# Altium schematic symbol library jlcpcb_2025_04_inductors_extended_0402.schlib: 1396 symbols (part 6 of 8) (continued)
## SCC1005C3N3SSP
designator L?  Inductance: 3.3nH
Inductor, 3.3nH, 190mΩ, 400mA, SMD 0402; Manufacturer: Sunltech Tech; Manufacturer Part Number: SCC1005C3N3SSP; Package Size: 0402; JLCPCB Basic Part: No; JLCPCB Part Number: C219529; Supplier 1: LCSC; Category: Inductors; Supplier Part Number 1: C219529; Rated Current: 400mA; DC Resistance: 190mΩ; RoHS: Yes; ComponentLink1Description: Datasheet; ComponentLink1URL: https://wmsc.lcsc.com/wmsc/upload/file/pdf/v2/lcsc/2304140030_Sunltech-Tech-SCC1005C3N3SSP_C219529.pdf; ComponentLink2Description: JLCPCB Part URL; ComponentLink2URL: https://jlcpcb.com/partdetail/C219529; ComponentLink3Description: LCSC Part URL; ComponentLink3URL: https://lcsc.com/product-detail/Inductors-SMD_Sunltech-Tech-Sunltech-Tech-SCC1005C3N3SSP_C219529.html
footprint IND-0402 (0402 (1005M) Inductor)
pins: 1, 2

## SCC1005C3N6SSP
designator L?  Inductance: 3.6nH
Inductor, 3.6nH, 220mΩ, 400mA, SMD 0402; Manufacturer: Sunltech Tech; Manufacturer Part Number: SCC1005C3N6SSP; Package Size: 0402; JLCPCB Basic Part: No; JLCPCB Part Number: C219530; Supplier 1: LCSC; Category: Inductors; Supplier Part Number 1: C219530; Rated Current: 400mA; DC Resistance: 220mΩ; RoHS: Yes; ComponentLink1Description: Datasheet; ComponentLink1URL: https://wmsc.lcsc.com/wmsc/upload/file/pdf/v2/lcsc/2304140030_Sunltech-Tech-SCC1005C3N6SSP_C219530.pdf; ComponentLink2Description: JLCPCB Part URL; ComponentLink2URL: https://jlcpcb.com/partdetail/C219530; ComponentLink3Description: LCSC Part URL; ComponentLink3URL: https://lcsc.com/product-detail/Inductors-SMD_Sunltech-Tech-Sunltech-Tech-SCC1005C3N6SSP_C219530.html
footprint IND-0402 (0402 (1005M) Inductor)
pins: 1, 2

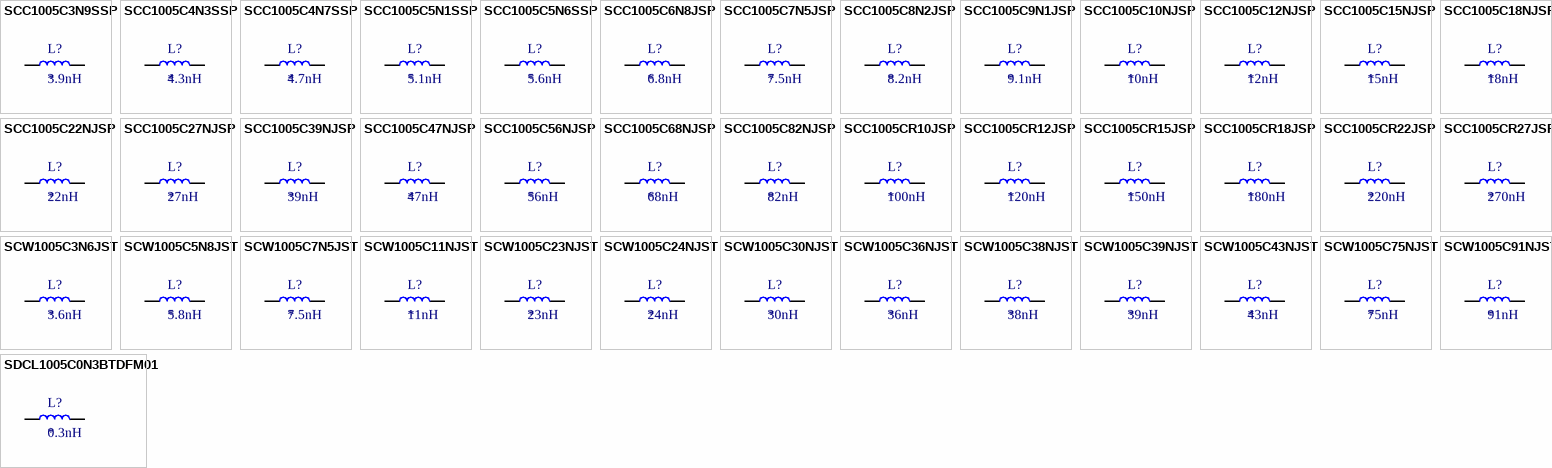
[diagram p25: symbols SCC1005C3N9SSP to SDCL1005C0N3BTDFM01]

## SCC1005C3N9SSP
designator L?  Inductance: 3.9nH
Inductor, 3.9nH, 220mΩ, 400mA, SMD 0402; Manufacturer: Sunltech Tech; Manufacturer Part Number: SCC1005C3N9SSP; Package Size: 0402; JLCPCB Basic Part: No; JLCPCB Part Number: C219531; Supplier 1: LCSC; Category: Inductors; Supplier Part Number 1: C219531; Rated Current: 400mA; DC Resistance: 220mΩ; RoHS: Yes; ComponentLink1Description: Datasheet; ComponentLink1URL: https://wmsc.lcsc.com/wmsc/upload/file/pdf/v2/lcsc/2304140030_Sunltech-Tech-SCC1005C3N9SSP_C219531.pdf; ComponentLink2Description: JLCPCB Part URL; ComponentLink2URL: https://jlcpcb.com/partdetail/C219531; ComponentLink3Description: LCSC Part URL; ComponentLink3URL: https://lcsc.com/product-detail/Inductors-SMD_Sunltech-Tech-Sunltech-Tech-SCC1005C3N9SSP_C219531.html
footprint IND-0402 (0402 (1005M) Inductor)
pins: 1, 2

## SCC1005C4N3SSP
designator L?  Inductance: 4.3nH
Inductor, 4.3nH, 240mΩ, 400mA, SMD 0402; Manufacturer: Sunltech Tech; Manufacturer Part Number: SCC1005C4N3SSP; Package Size: 0402; JLCPCB Basic Part: No; JLCPCB Part Number: C219532; Supplier 1: LCSC; Category: Inductors; Supplier Part Number 1: C219532; Rated Current: 400mA; DC Resistance: 240mΩ; RoHS: Yes; ComponentLink1Description: Datasheet; ComponentLink1URL: https://wmsc.lcsc.com/wmsc/upload/file/pdf/v2/lcsc/2304140030_Sunltech-Tech-SCC1005C4N3SSP_C219532.pdf; ComponentLink2Description: JLCPCB Part URL; ComponentLink2URL: https://jlcpcb.com/partdetail/C219532; ComponentLink3Description: LCSC Part URL; ComponentLink3URL: https://lcsc.com/product-detail/Inductors-SMD_Sunltech-Tech-Sunltech-Tech-SCC1005C4N3SSP_C219532.html
footprint IND-0402 (0402 (1005M) Inductor)
pins: 1, 2

## SCC1005C4N7SSP
designator L?  Inductance: 4.7nH
Inductor, 4.7nH, 240mΩ, 400mA, SMD 0402; Manufacturer: Sunltech Tech; Manufacturer Part Number: SCC1005C4N7SSP; Package Size: 0402; JLCPCB Basic Part: No; JLCPCB Part Number: C219533; Supplier 1: LCSC; Category: Inductors; Supplier Part Number 1: C219533; Rated Current: 400mA; DC Resistance: 240mΩ; RoHS: Yes; ComponentLink1Description: Datasheet; ComponentLink1URL: https://wmsc.lcsc.com/wmsc/upload/file/pdf/v2/lcsc/2304140030_Sunltech-Tech-SCC1005C4N7SSP_C219533.pdf; ComponentLink2Description: JLCPCB Part URL; ComponentLink2URL: https://jlcpcb.com/partdetail/C219533; ComponentLink3Description: LCSC Part URL; ComponentLink3URL: https://lcsc.com/product-detail/Inductors-SMD_Sunltech-Tech-Sunltech-Tech-SCC1005C4N7SSP_C219533.html
footprint IND-0402 (0402 (1005M) Inductor)
pins: 1, 2

## SCC1005C5N1SSP
designator L?  Inductance: 5.1nH
Inductor, 5.1nH, 260mΩ, 400mA, SMD 0402; Manufacturer: Sunltech Tech; Manufacturer Part Number: SCC1005C5N1SSP; Package Size: 0402; JLCPCB Basic Part: No; JLCPCB Part Number: C219534; Supplier 1: LCSC; Category: Inductors; Supplier Part Number 1: C219534; Rated Current: 400mA; DC Resistance: 260mΩ; RoHS: Yes; ComponentLink1Description: Datasheet; ComponentLink1URL: https://wmsc.lcsc.com/wmsc/upload/file/pdf/v2/lcsc/2304140030_Sunltech-Tech-SCC1005C5N1SSP_C219534.pdf; ComponentLink2Description: JLCPCB Part URL; ComponentLink2URL: https://jlcpcb.com/partdetail/C219534; ComponentLink3Description: LCSC Part URL; ComponentLink3URL: https://lcsc.com/product-detail/Inductors-SMD_Sunltech-Tech-Sunltech-Tech-SCC1005C5N1SSP_C219534.html
footprint IND-0402 (0402 (1005M) Inductor)
pins: 1, 2

## SCC1005C5N6SSP
designator L?  Inductance: 5.6nH
Inductor, 5.6nH, 270mΩ, 400mA, SMD 0402; Manufacturer: Sunltech Tech; Manufacturer Part Number: SCC1005C5N6SSP; Package Size: 0402; JLCPCB Basic Part: No; JLCPCB Part Number: C219535; Supplier 1: LCSC; Category: Inductors; Supplier Part Number 1: C219535; Rated Current: 400mA; DC Resistance: 270mΩ; RoHS: Yes; ComponentLink1Description: Datasheet; ComponentLink1URL: https://wmsc.lcsc.com/wmsc/upload/file/pdf/v2/lcsc/2304140030_Sunltech-Tech-SCC1005C5N6SSP_C219535.pdf; ComponentLink2Description: JLCPCB Part URL; ComponentLink2URL: https://jlcpcb.com/partdetail/C219535; ComponentLink3Description: LCSC Part URL; ComponentLink3URL: https://lcsc.com/product-detail/Inductors-SMD_Sunltech-Tech-Sunltech-Tech-SCC1005C5N6SSP_C219535.html
footprint IND-0402 (0402 (1005M) Inductor)
pins: 1, 2

## SCC1005C6N8JSP
designator L?  Inductance: 6.8nH
Inductor, 6.8nH, ±5%, 320mΩ, 300mA, SMD 0402; Manufacturer: Sunltech Tech; Manufacturer Part Number: SCC1005C6N8JSP; Package Size: 0402; JLCPCB Basic Part: No; JLCPCB Part Number: C219537; Supplier 1: LCSC; Category: Inductors; Supplier Part Number 1: C219537; Tolerance: ±5%; Rated Current: 300mA; DC Resistance: 320mΩ; RoHS: Yes; ComponentLink1Description: Datasheet; ComponentLink1URL: https://wmsc.lcsc.com/wmsc/upload/file/pdf/v2/lcsc/2304140030_Sunltech-Tech-SCC1005C6N8JSP_C219537.pdf; ComponentLink2Description: JLCPCB Part URL; ComponentLink2URL: https://jlcpcb.com/partdetail/C219537; ComponentLink3Description: LCSC Part URL; ComponentLink3URL: https://lcsc.com/product-detail/Inductors-SMD_Sunltech-Tech-Sunltech-Tech-SCC1005C6N8JSP_C219537.html
footprint IND-0402 (0402 (1005M) Inductor)
pins: 1, 2

## SCC1005C7N5JSP
designator L?  Inductance: 7.5nH
Inductor, 7.5nH, ±5%, 370mΩ, 300mA, SMD 0402; Manufacturer: Sunltech Tech; Manufacturer Part Number: SCC1005C7N5JSP; Package Size: 0402; JLCPCB Basic Part: No; JLCPCB Part Number: C219538; Supplier 1: LCSC; Category: Inductors; Supplier Part Number 1: C219538; Tolerance: ±5%; Rated Current: 300mA; DC Resistance: 370mΩ; RoHS: Yes; ComponentLink1Description: Datasheet; ComponentLink1URL: https://wmsc.lcsc.com/wmsc/upload/file/pdf/v2/lcsc/2304140030_Sunltech-Tech-SCC1005C7N5JSP_C219538.pdf; ComponentLink2Description: JLCPCB Part URL; ComponentLink2URL: https://jlcpcb.com/partdetail/C219538; ComponentLink3Description: LCSC Part URL; ComponentLink3URL: https://lcsc.com/product-detail/Inductors-SMD_Sunltech-Tech-Sunltech-Tech-SCC1005C7N5JSP_C219538.html
footprint IND-0402 (0402 (1005M) Inductor)
pins: 1, 2

## SCC1005C8N2JSP
designator L?  Inductance: 8.2nH
Inductor, 8.2nH, ±5%, 370mΩ, 300mA, SMD 0402; Manufacturer: Sunltech Tech; Manufacturer Part Number: SCC1005C8N2JSP; Package Size: 0402; JLCPCB Basic Part: No; JLCPCB Part Number: C219539; Supplier 1: LCSC; Category: Inductors; Supplier Part Number 1: C219539; Tolerance: ±5%; Rated Current: 300mA; DC Resistance: 370mΩ; RoHS: Yes; ComponentLink1Description: Datasheet; ComponentLink1URL: https://wmsc.lcsc.com/wmsc/upload/file/pdf/v2/lcsc/2304140030_Sunltech-Tech-SCC1005C8N2JSP_C219539.pdf; ComponentLink2Description: JLCPCB Part URL; ComponentLink2URL: https://jlcpcb.com/partdetail/C219539; ComponentLink3Description: LCSC Part URL; ComponentLink3URL: https://lcsc.com/product-detail/Inductors-SMD_Sunltech-Tech-Sunltech-Tech-SCC1005C8N2JSP_C219539.html
footprint IND-0402 (0402 (1005M) Inductor)
pins: 1, 2

## SCC1005C9N1JSP
designator L?  Inductance: 9.1nH
Inductor, 9.1nH, ±5%, 420mΩ, 300mA, SMD 0402; Manufacturer: Sunltech Tech; Manufacturer Part Number: SCC1005C9N1JSP; Package Size: 0402; JLCPCB Basic Part: No; JLCPCB Part Number: C219540; Supplier 1: LCSC; Category: Inductors; Supplier Part Number 1: C219540; Tolerance: ±5%; Rated Current: 300mA; DC Resistance: 420mΩ; RoHS: Yes; ComponentLink1Description: Datasheet; ComponentLink1URL: https://wmsc.lcsc.com/wmsc/upload/file/pdf/v2/lcsc/2304140030_Sunltech-Tech-SCC1005C9N1JSP_C219540.pdf; ComponentLink2Description: JLCPCB Part URL; ComponentLink2URL: https://jlcpcb.com/partdetail/C219540; ComponentLink3Description: LCSC Part URL; ComponentLink3URL: https://lcsc.com/product-detail/Inductors-SMD_Sunltech-Tech-Sunltech-Tech-SCC1005C9N1JSP_C219540.html
footprint IND-0402 (0402 (1005M) Inductor)
pins: 1, 2

## SCC1005C10NJSP
designator L?  Inductance: 10nH
Inductor, 10nH, ±5%, 420mΩ, 300mA, SMD 0402; Manufacturer: Sunltech Tech; Manufacturer Part Number: SCC1005C10NJSP; Package Size: 0402; JLCPCB Basic Part: No; JLCPCB Part Number: C219541; Supplier 1: LCSC; Category: Inductors; Supplier Part Number 1: C219541; Tolerance: ±5%; Rated Current: 300mA; DC Resistance: 420mΩ; RoHS: Yes; ComponentLink1Description: Datasheet; ComponentLink1URL: https://wmsc.lcsc.com/wmsc/upload/file/pdf/v2/lcsc/2304140030_Sunltech-Tech-SCC1005C10NJSP_C219541.pdf; ComponentLink2Description: JLCPCB Part URL; ComponentLink2URL: https://jlcpcb.com/partdetail/C219541; ComponentLink3Description: LCSC Part URL; ComponentLink3URL: https://lcsc.com/product-detail/Inductors-SMD_Sunltech-Tech-Sunltech-Tech-SCC1005C10NJSP_C219541.html
footprint IND-0402 (0402 (1005M) Inductor)
pins: 1, 2

## SCC1005C12NJSP
designator L?  Inductance: 12nH
Inductor, 12nH, ±5%, 500mΩ, 300mA, SMD 0402; Manufacturer: Sunltech Tech; Manufacturer Part Number: SCC1005C12NJSP; Package Size: 0402; JLCPCB Basic Part: No; JLCPCB Part Number: C219542; Supplier 1: LCSC; Category: Inductors; Supplier Part Number 1: C219542; Tolerance: ±5%; Rated Current: 300mA; DC Resistance: 500mΩ; RoHS: Yes; ComponentLink1Description: Datasheet; ComponentLink1URL: https://wmsc.lcsc.com/wmsc/upload/file/pdf/v2/lcsc/2304140030_Sunltech-Tech-SCC1005C12NJSP_C219542.pdf; ComponentLink2Description: JLCPCB Part URL; ComponentLink2URL: https://jlcpcb.com/partdetail/C219542; ComponentLink3Description: LCSC Part URL; ComponentLink3URL: https://lcsc.com/product-detail/Inductors-SMD_Sunltech-Tech-Sunltech-Tech-SCC1005C12NJSP_C219542.html
footprint IND-0402 (0402 (1005M) Inductor)
pins: 1, 2

## SCC1005C15NJSP
designator L?  Inductance: 15nH
Inductor, 15nH, ±5%, 550mΩ, 300mA, SMD 0402; Manufacturer: Sunltech Tech; Manufacturer Part Number: SCC1005C15NJSP; Package Size: 0402; JLCPCB Basic Part: No; JLCPCB Part Number: C219543; Supplier 1: LCSC; Category: Inductors; Supplier Part Number 1: C219543; Tolerance: ±5%; Rated Current: 300mA; DC Resistance: 550mΩ; RoHS: Yes; ComponentLink1Description: Datasheet; ComponentLink1URL: https://wmsc.lcsc.com/wmsc/upload/file/pdf/v2/lcsc/2304140030_Sunltech-Tech-SCC1005C15NJSP_C219543.pdf; ComponentLink2Description: JLCPCB Part URL; ComponentLink2URL: https://jlcpcb.com/partdetail/C219543; ComponentLink3Description: LCSC Part URL; ComponentLink3URL: https://lcsc.com/product-detail/Inductors-SMD_Sunltech-Tech-Sunltech-Tech-SCC1005C15NJSP_C219543.html
footprint IND-0402 (0402 (1005M) Inductor)
pins: 1, 2

## SCC1005C18NJSP
designator L?  Inductance: 18nH
Inductor, 18nH, ±5%, 650mΩ, 300mA, SMD 0402; Manufacturer: Sunltech Tech; Manufacturer Part Number: SCC1005C18NJSP; Package Size: 0402; JLCPCB Basic Part: No; JLCPCB Part Number: C219544; Supplier 1: LCSC; Category: Inductors; Supplier Part Number 1: C219544; Tolerance: ±5%; Rated Current: 300mA; DC Resistance: 650mΩ; RoHS: Yes; ComponentLink1Description: Datasheet; ComponentLink1URL: https://wmsc.lcsc.com/wmsc/upload/file/pdf/v2/lcsc/2304140030_Sunltech-Tech-SCC1005C18NJSP_C219544.pdf; ComponentLink2Description: JLCPCB Part URL; ComponentLink2URL: https://jlcpcb.com/partdetail/C219544; ComponentLink3Description: LCSC Part URL; ComponentLink3URL: https://lcsc.com/product-detail/Inductors-SMD_Sunltech-Tech-Sunltech-Tech-SCC1005C18NJSP_C219544.html
footprint IND-0402 (0402 (1005M) Inductor)
pins: 1, 2

## SCC1005C22NJSP
designator L?  Inductance: 22nH
Inductor, 22nH, ±5%, 800mΩ, 200mA, SMD 0402; Manufacturer: Sunltech Tech; Manufacturer Part Number: SCC1005C22NJSP; Package Size: 0402; JLCPCB Basic Part: No; JLCPCB Part Number: C219545; Supplier 1: LCSC; Category: Inductors; Supplier Part Number 1: C219545; Tolerance: ±5%; Rated Current: 200mA; DC Resistance: 800mΩ; RoHS: Yes; ComponentLink1Description: Datasheet; ComponentLink1URL: https://wmsc.lcsc.com/wmsc/upload/file/pdf/v2/lcsc/2304140030_Sunltech-Tech-SCC1005C22NJSP_C219545.pdf; ComponentLink2Description: JLCPCB Part URL; ComponentLink2URL: https://jlcpcb.com/partdetail/C219545; ComponentLink3Description: LCSC Part URL; ComponentLink3URL: https://lcsc.com/product-detail/Inductors-SMD_Sunltech-Tech-Sunltech-Tech-SCC1005C22NJSP_C219545.html
footprint IND-0402 (0402 (1005M) Inductor)
pins: 1, 2

## SCC1005C27NJSP
designator L?  Inductance: 27nH
Inductor, 27nH, ±5%, 900mΩ, 200mA, SMD 0402; Manufacturer: Sunltech Tech; Manufacturer Part Number: SCC1005C27NJSP; Package Size: 0402; JLCPCB Basic Part: No; JLCPCB Part Number: C219546; Supplier 1: LCSC; Category: Inductors; Supplier Part Number 1: C219546; Tolerance: ±5%; Rated Current: 200mA; DC Resistance: 900mΩ; RoHS: Yes; ComponentLink1Description: Datasheet; ComponentLink1URL: https://wmsc.lcsc.com/wmsc/upload/file/pdf/v2/lcsc/2304140030_Sunltech-Tech-SCC1005C27NJSP_C219546.pdf; ComponentLink2Description: JLCPCB Part URL; ComponentLink2URL: https://jlcpcb.com/partdetail/C219546; ComponentLink3Description: LCSC Part URL; ComponentLink3URL: https://lcsc.com/product-detail/Inductors-SMD_Sunltech-Tech-Sunltech-Tech-SCC1005C27NJSP_C219546.html
footprint IND-0402 (0402 (1005M) Inductor)
pins: 1, 2

## SCC1005C39NJSP
designator L?  Inductance: 39nH
Inductor, 39nH, ±5%, 1.2Ω, 150mA, SMD 0402; Manufacturer: Sunltech Tech; Manufacturer Part Number: SCC1005C39NJSP; Package Size: 0402; JLCPCB Basic Part: No; JLCPCB Part Number: C219548; Supplier 1: LCSC; Category: Inductors; Supplier Part Number 1: C219548; Tolerance: ±5%; Rated Current: 150mA; DC Resistance: 1.2Ω; RoHS: Yes; ComponentLink1Description: Datasheet; ComponentLink1URL: https://wmsc.lcsc.com/wmsc/upload/file/pdf/v2/lcsc/2304140030_Sunltech-Tech-SCC1005C39NJSP_C219548.pdf; ComponentLink2Description: JLCPCB Part URL; ComponentLink2URL: https://jlcpcb.com/partdetail/C219548; ComponentLink3Description: LCSC Part URL; ComponentLink3URL: https://lcsc.com/product-detail/Inductors-SMD_Sunltech-Tech-Sunltech-Tech-SCC1005C39NJSP_C219548.html
footprint IND-0402 (0402 (1005M) Inductor)
pins: 1, 2

## SCC1005C47NJSP
designator L?  Inductance: 47nH
Inductor, 47nH, ±5%, 1.3Ω, 150mA, SMD 0402; Manufacturer: Sunltech Tech; Manufacturer Part Number: SCC1005C47NJSP; Package Size: 0402; JLCPCB Basic Part: No; JLCPCB Part Number: C219549; Supplier 1: LCSC; Category: Inductors; Supplier Part Number 1: C219549; Tolerance: ±5%; Rated Current: 150mA; DC Resistance: 1.3Ω; RoHS: Yes; ComponentLink1Description: Datasheet; ComponentLink1URL: https://wmsc.lcsc.com/wmsc/upload/file/pdf/v2/lcsc/2304140030_Sunltech-Tech-SCC1005C47NJSP_C219549.pdf; ComponentLink2Description: JLCPCB Part URL; ComponentLink2URL: https://jlcpcb.com/partdetail/C219549; ComponentLink3Description: LCSC Part URL; ComponentLink3URL: https://lcsc.com/product-detail/Inductors-SMD_Sunltech-Tech-Sunltech-Tech-SCC1005C47NJSP_C219549.html
footprint IND-0402 (0402 (1005M) Inductor)
pins: 1, 2

## SCC1005C56NJSP
designator L?  Inductance: 56nH
Inductor, 56nH, ±5%, 1.6Ω, 150mA, SMD 0402; Manufacturer: Sunltech Tech; Manufacturer Part Number: SCC1005C56NJSP; Package Size: 0402; JLCPCB Basic Part: No; JLCPCB Part Number: C219550; Supplier 1: LCSC; Category: Inductors; Supplier Part Number 1: C219550; Tolerance: ±5%; Rated Current: 150mA; DC Resistance: 1.6Ω; RoHS: Yes; ComponentLink1Description: Datasheet; ComponentLink1URL: https://wmsc.lcsc.com/wmsc/upload/file/pdf/v2/lcsc/2304140030_Sunltech-Tech-SCC1005C56NJSP_C219550.pdf; ComponentLink2Description: JLCPCB Part URL; ComponentLink2URL: https://jlcpcb.com/partdetail/C219550; ComponentLink3Description: LCSC Part URL; ComponentLink3URL: https://lcsc.com/product-detail/Inductors-SMD_Sunltech-Tech-Sunltech-Tech-SCC1005C56NJSP_C219550.html
footprint IND-0402 (0402 (1005M) Inductor)
pins: 1, 2

## SCC1005C68NJSP
designator L?  Inductance: 68nH
Inductor, 68nH, ±5%, 2.1Ω, 150mA, SMD 0402; Manufacturer: Sunltech Tech; Manufacturer Part Number: SCC1005C68NJSP; Package Size: 0402; JLCPCB Basic Part: No; JLCPCB Part Number: C219551; Supplier 1: LCSC; Category: Inductors; Supplier Part Number 1: C219551; Tolerance: ±5%; Rated Current: 150mA; DC Resistance: 2.1Ω; RoHS: Yes; ComponentLink1Description: Datasheet; ComponentLink1URL: https://wmsc.lcsc.com/wmsc/upload/file/pdf/v2/lcsc/2304140030_Sunltech-Tech-SCC1005C68NJSP_C219551.pdf; ComponentLink2Description: JLCPCB Part URL; ComponentLink2URL: https://jlcpcb.com/partdetail/C219551; ComponentLink3Description: LCSC Part URL; ComponentLink3URL: https://lcsc.com/product-detail/Inductors-SMD_Sunltech-Tech-Sunltech-Tech-SCC1005C68NJSP_C219551.html
footprint IND-0402 (0402 (1005M) Inductor)
pins: 1, 2

## SCC1005C82NJSP
designator L?  Inductance: 82nH
Inductor, 82nH, ±5%, 2.4Ω, 150mA, SMD 0402; Manufacturer: Sunltech Tech; Manufacturer Part Number: SCC1005C82NJSP; Package Size: 0402; JLCPCB Basic Part: No; JLCPCB Part Number: C219552; Supplier 1: LCSC; Category: Inductors; Supplier Part Number 1: C219552; Tolerance: ±5%; Rated Current: 150mA; DC Resistance: 2.4Ω; RoHS: Yes; ComponentLink1Description: Datasheet; ComponentLink1URL: https://wmsc.lcsc.com/wmsc/upload/file/pdf/v2/lcsc/2304140030_Sunltech-Tech-SCC1005C82NJSP_C219552.pdf; ComponentLink2Description: JLCPCB Part URL; ComponentLink2URL: https://jlcpcb.com/partdetail/C219552; ComponentLink3Description: LCSC Part URL; ComponentLink3URL: https://lcsc.com/product-detail/Inductors-SMD_Sunltech-Tech-Sunltech-Tech-SCC1005C82NJSP_C219552.html
footprint IND-0402 (0402 (1005M) Inductor)
pins: 1, 2

## SCC1005CR10JSP
designator L?  Inductance: 100nH
Inductor, 100nH, ±5%, 2.6Ω, 150mA, SMD 0402; Manufacturer: Sunltech Tech; Manufacturer Part Number: SCC1005CR10JSP; Package Size: 0402; JLCPCB Basic Part: No; JLCPCB Part Number: C219553; Supplier 1: LCSC; Category: Inductors; Supplier Part Number 1: C219553; Tolerance: ±5%; Rated Current: 150mA; DC Resistance: 2.6Ω; RoHS: Yes; ComponentLink1Description: Datasheet; ComponentLink1URL: https://wmsc.lcsc.com/wmsc/upload/file/pdf/v2/lcsc/2304140030_Sunltech-Tech-SCC1005CR10JSP_C219553.pdf; ComponentLink2Description: JLCPCB Part URL; ComponentLink2URL: https://jlcpcb.com/partdetail/C219553; ComponentLink3Description: LCSC Part URL; ComponentLink3URL: https://lcsc.com/product-detail/Inductors-SMD_Sunltech-Tech-Sunltech-Tech-SCC1005CR10JSP_C219553.html
footprint IND-0402 (0402 (1005M) Inductor)
pins: 1, 2

## SCC1005CR12JSP
designator L?  Inductance: 120nH
Inductor, 120nH, ±5%, 2.8Ω, 150mA, SMD 0402; Manufacturer: Sunltech Tech; Manufacturer Part Number: SCC1005CR12JSP; Package Size: 0402; JLCPCB Basic Part: No; JLCPCB Part Number: C219554; Supplier 1: LCSC; Category: Inductors; Supplier Part Number 1: C219554; Tolerance: ±5%; Rated Current: 150mA; DC Resistance: 2.8Ω; RoHS: Yes; ComponentLink1Description: Datasheet; ComponentLink1URL: https://wmsc.lcsc.com/wmsc/upload/file/pdf/v2/lcsc/2304140030_Sunltech-Tech-SCC1005CR12JSP_C219554.pdf; ComponentLink2Description: JLCPCB Part URL; ComponentLink2URL: https://jlcpcb.com/partdetail/C219554; ComponentLink3Description: LCSC Part URL; ComponentLink3URL: https://lcsc.com/product-detail/Inductors-SMD_Sunltech-Tech-Sunltech-Tech-SCC1005CR12JSP_C219554.html
footprint IND-0402 (0402 (1005M) Inductor)
pins: 1, 2

## SCC1005CR15JSP
designator L?  Inductance: 150nH
Inductor, 150nH, ±5%, 3.2Ω, 100mA, SMD 0402; Manufacturer: Sunltech Tech; Manufacturer Part Number: SCC1005CR15JSP; Package Size: 0402; JLCPCB Basic Part: No; JLCPCB Part Number: C219675; Supplier 1: LCSC; Category: Inductors; Supplier Part Number 1: C219675; Tolerance: ±5%; Rated Current: 100mA; DC Resistance: 3.2Ω; RoHS: Yes; ComponentLink1Description: Datasheet; ComponentLink1URL: https://wmsc.lcsc.com/wmsc/upload/file/pdf/v2/lcsc/2304140030_Sunltech-Tech-SCC1005CR15JSP_C219675.pdf; ComponentLink2Description: JLCPCB Part URL; ComponentLink2URL: https://jlcpcb.com/partdetail/C219675; ComponentLink3Description: LCSC Part URL; ComponentLink3URL: https://lcsc.com/product-detail/Inductors-SMD_Sunltech-Tech-Sunltech-Tech-SCC1005CR15JSP_C219675.html
footprint IND-0402 (0402 (1005M) Inductor)
pins: 1, 2

## SCC1005CR18JSP
designator L?  Inductance: 180nH
Inductor, 180nH, ±5%, 3.7Ω, 100mA, SMD 0402; Manufacturer: Sunltech Tech; Manufacturer Part Number: SCC1005CR18JSP; Package Size: 0402; JLCPCB Basic Part: No; JLCPCB Part Number: C219676; Supplier 1: LCSC; Category: Inductors; Supplier Part Number 1: C219676; Tolerance: ±5%; Rated Current: 100mA; DC Resistance: 3.7Ω; RoHS: Yes; ComponentLink1Description: Datasheet; ComponentLink1URL: https://wmsc.lcsc.com/wmsc/upload/file/pdf/v2/lcsc/2304140030_Sunltech-Tech-SCC1005CR18JSP_C219676.pdf; ComponentLink2Description: JLCPCB Part URL; ComponentLink2URL: https://jlcpcb.com/partdetail/C219676; ComponentLink3Description: LCSC Part URL; ComponentLink3URL: https://lcsc.com/product-detail/Inductors-SMD_Sunltech-Tech-Sunltech-Tech-SCC1005CR18JSP_C219676.html
footprint IND-0402 (0402 (1005M) Inductor)
pins: 1, 2

## SCC1005CR22JSP
designator L?  Inductance: 220nH
Inductor, 220nH, ±5%, 4Ω, 100mA, SMD 0402; Manufacturer: Sunltech Tech; Manufacturer Part Number: SCC1005CR22JSP; Package Size: 0402; JLCPCB Basic Part: No; JLCPCB Part Number: C219677; Supplier 1: LCSC; Category: Inductors; Supplier Part Number 1: C219677; Tolerance: ±5%; Rated Current: 100mA; DC Resistance: 4Ω; RoHS: Yes; ComponentLink1Description: Datasheet; ComponentLink1URL: https://wmsc.lcsc.com/wmsc/upload/file/pdf/v2/lcsc/2304140030_Sunltech-Tech-SCC1005CR22JSP_C219677.pdf; ComponentLink2Description: JLCPCB Part URL; ComponentLink2URL: https://jlcpcb.com/partdetail/C219677; ComponentLink3Description: LCSC Part URL; ComponentLink3URL: https://lcsc.com/product-detail/Inductors-SMD_Sunltech-Tech-Sunltech-Tech-SCC1005CR22JSP_C219677.html
footprint IND-0402 (0402 (1005M) Inductor)
pins: 1, 2

## SCC1005CR27JSP
designator L?  Inductance: 270nH
Inductor, 270nH, ±5%, 4.5Ω, 100mA, SMD 0402; Manufacturer: Sunltech Tech; Manufacturer Part Number: SCC1005CR27JSP; Package Size: 0402; JLCPCB Basic Part: No; JLCPCB Part Number: C219678; Supplier 1: LCSC; Category: Inductors; Supplier Part Number 1: C219678; Tolerance: ±5%; Rated Current: 100mA; DC Resistance: 4.5Ω; RoHS: Yes; ComponentLink1Description: Datasheet; ComponentLink1URL: https://wmsc.lcsc.com/wmsc/upload/file/pdf/v2/lcsc/2304140030_Sunltech-Tech-SCC1005CR27JSP_C219678.pdf; ComponentLink2Description: JLCPCB Part URL; ComponentLink2URL: https://jlcpcb.com/partdetail/C219678; ComponentLink3Description: LCSC Part URL; ComponentLink3URL: https://lcsc.com/product-detail/Inductors-SMD_Sunltech-Tech-Sunltech-Tech-SCC1005CR27JSP_C219678.html
footprint IND-0402 (0402 (1005M) Inductor)
pins: 1, 2

## SCW1005C3N6JST
designator L?  Inductance: 3.6nH
Inductor, 3.6nH, ±5%, 63mΩ, 790mA, SMD 0402; Manufacturer: Sunltech Tech; Manufacturer Part Number: SCW1005C3N6JST; Package Size: 0402; JLCPCB Basic Part: No; JLCPCB Part Number: C330839; Supplier 1: LCSC; Category: Inductors; Supplier Part Number 1: C330839; Tolerance: ±5%; Rated Current: 790mA; DC Resistance: 63mΩ; RoHS: Yes; ComponentLink1Description: Datasheet; ComponentLink1URL: https://wmsc.lcsc.com/wmsc/upload/file/pdf/v2/lcsc/2304140030_Sunltech-Tech-SCW1005C3N6JST_C330839.pdf; ComponentLink2Description: JLCPCB Part URL; ComponentLink2URL: https://jlcpcb.com/partdetail/C330839; ComponentLink3Description: LCSC Part URL; ComponentLink3URL: https://lcsc.com/product-detail/Inductors-SMD_Sunltech-Tech-Sunltech-Tech-SCW1005C3N6JST_C330839.html
footprint IND-0402 (0402 (1005M) Inductor)
pins: 1, 2

## SCW1005C5N8JST
designator L?  Inductance: 5.8nH
Inductor, 5.8nH, ±5%, 78mΩ, 710mA, SMD 0402; Manufacturer: Sunltech Tech; Manufacturer Part Number: SCW1005C5N8JST; Package Size: 0402; JLCPCB Basic Part: No; JLCPCB Part Number: C330845; Supplier 1: LCSC; Category: Inductors; Supplier Part Number 1: C330845; Tolerance: ±5%; Rated Current: 710mA; DC Resistance: 78mΩ; RoHS: Yes; ComponentLink1Description: Datasheet; ComponentLink1URL: https://wmsc.lcsc.com/wmsc/upload/file/pdf/v2/lcsc/2304140030_Sunltech-Tech-SCW1005C5N8JST_C330845.pdf; ComponentLink2Description: JLCPCB Part URL; ComponentLink2URL: https://jlcpcb.com/partdetail/C330845; ComponentLink3Description: LCSC Part URL; ComponentLink3URL: https://lcsc.com/product-detail/Inductors-SMD_Sunltech-Tech-Sunltech-Tech-SCW1005C5N8JST_C330845.html
footprint IND-0402 (0402 (1005M) Inductor)
pins: 1, 2

## SCW1005C7N5JST
designator L?  Inductance: 7.5nH
Inductor, 7.5nH, ±5%, 120mΩ, 570mA, SMD 0402; Manufacturer: Sunltech Tech; Manufacturer Part Number: SCW1005C7N5JST; Package Size: 0402; JLCPCB Basic Part: No; JLCPCB Part Number: C330848; Supplier 1: LCSC; Category: Inductors; Supplier Part Number 1: C330848; Tolerance: ±5%; Rated Current: 570mA; DC Resistance: 120mΩ; RoHS: Yes; ComponentLink1Description: Datasheet; ComponentLink1URL: https://wmsc.lcsc.com/wmsc/upload/file/pdf/v2/lcsc/2304140030_Sunltech-Tech-SCW1005C7N5JST_C330848.pdf; ComponentLink2Description: JLCPCB Part URL; ComponentLink2URL: https://jlcpcb.com/partdetail/C330848; ComponentLink3Description: LCSC Part URL; ComponentLink3URL: https://lcsc.com/product-detail/Inductors-SMD_Sunltech-Tech-Sunltech-Tech-SCW1005C7N5JST_C330848.html
footprint IND-0402 (0402 (1005M) Inductor)
pins: 1, 2

## SCW1005C11NJST
designator L?  Inductance: 11nH
Inductor, 11nH, ±5%, 120mΩ, 570mA, SMD 0402; Manufacturer: Sunltech Tech; Manufacturer Part Number: SCW1005C11NJST; Package Size: 0402; JLCPCB Basic Part: No; JLCPCB Part Number: C330852; Supplier 1: LCSC; Category: Inductors; Supplier Part Number 1: C330852; Tolerance: ±5%; Rated Current: 570mA; DC Resistance: 120mΩ; RoHS: Yes; ComponentLink1Description: Datasheet; ComponentLink1URL: https://wmsc.lcsc.com/wmsc/upload/file/pdf/v2/lcsc/2304140030_Sunltech-Tech-SCW1005C11NJST_C330852.pdf; ComponentLink2Description: JLCPCB Part URL; ComponentLink2URL: https://jlcpcb.com/partdetail/C330852; ComponentLink3Description: LCSC Part URL; ComponentLink3URL: https://lcsc.com/product-detail/Inductors-SMD_Sunltech-Tech-Sunltech-Tech-SCW1005C11NJST_C330852.html
footprint IND-0402 (0402 (1005M) Inductor)
pins: 1, 2

## SCW1005C23NJST
designator L?  Inductance: 23nH
Inductor, 23nH, ±5%, 360mΩ, 330mA, SMD 0402; Manufacturer: Sunltech Tech; Manufacturer Part Number: SCW1005C23NJST; Package Size: 0402; JLCPCB Basic Part: No; JLCPCB Part Number: C330862; Supplier 1: LCSC; Category: Inductors; Supplier Part Number 1: C330862; Tolerance: ±5%; Rated Current: 330mA; DC Resistance: 360mΩ; RoHS: Yes; ComponentLink1Description: Datasheet; ComponentLink1URL: https://wmsc.lcsc.com/wmsc/upload/file/pdf/v2/lcsc/2304140030_Sunltech-Tech-SCW1005C23NJST_C330862.pdf; ComponentLink2Description: JLCPCB Part URL; ComponentLink2URL: https://jlcpcb.com/partdetail/C330862; ComponentLink3Description: LCSC Part URL; ComponentLink3URL: https://lcsc.com/product-detail/Inductors-SMD_Sunltech-Tech-Sunltech-Tech-SCW1005C23NJST_C330862.html
footprint IND-0402 (0402 (1005M) Inductor)
pins: 1, 2

## SCW1005C24NJST
designator L?  Inductance: 24nH
Inductor, 24nH, ±5%, 360mΩ, 330mA, SMD 0402; Manufacturer: Sunltech Tech; Manufacturer Part Number: SCW1005C24NJST; Package Size: 0402; JLCPCB Basic Part: No; JLCPCB Part Number: C330863; Supplier 1: LCSC; Category: Inductors; Supplier Part Number 1: C330863; Tolerance: ±5%; Rated Current: 330mA; DC Resistance: 360mΩ; RoHS: Yes; ComponentLink1Description: Datasheet; ComponentLink1URL: https://wmsc.lcsc.com/wmsc/upload/file/pdf/v2/lcsc/2304140030_Sunltech-Tech-SCW1005C24NJST_C330863.pdf; ComponentLink2Description: JLCPCB Part URL; ComponentLink2URL: https://jlcpcb.com/partdetail/C330863; ComponentLink3Description: LCSC Part URL; ComponentLink3URL: https://lcsc.com/product-detail/Inductors-SMD_Sunltech-Tech-Sunltech-Tech-SCW1005C24NJST_C330863.html
footprint IND-0402 (0402 (1005M) Inductor)
pins: 1, 2

## SCW1005C30NJST
designator L?  Inductance: 30nH
Inductor, 30nH, ±5%, 380mΩ, 320mA, SMD 0402; Manufacturer: Sunltech Tech; Manufacturer Part Number: SCW1005C30NJST; Package Size: 0402; JLCPCB Basic Part: No; JLCPCB Part Number: C330865; Supplier 1: LCSC; Category: Inductors; Supplier Part Number 1: C330865; Tolerance: ±5%; Rated Current: 320mA; DC Resistance: 380mΩ; RoHS: Yes; ComponentLink1Description: Datasheet; ComponentLink1URL: https://wmsc.lcsc.com/wmsc/upload/file/pdf/v2/lcsc/2304140030_Sunltech-Tech-SCW1005C30NJST_C330865.pdf; ComponentLink2Description: JLCPCB Part URL; ComponentLink2URL: https://jlcpcb.com/partdetail/C330865; ComponentLink3Description: LCSC Part URL; ComponentLink3URL: https://lcsc.com/product-detail/Inductors-SMD_Sunltech-Tech-Sunltech-Tech-SCW1005C30NJST_C330865.html
footprint IND-0402 (0402 (1005M) Inductor)
pins: 1, 2

## SCW1005C36NJST
designator L?  Inductance: 36nH
Inductor, 36nH, ±5%, 600mΩ, 250mA, SMD 0402; Manufacturer: Sunltech Tech; Manufacturer Part Number: SCW1005C36NJST; Package Size: 0402; JLCPCB Basic Part: No; JLCPCB Part Number: C330867; Supplier 1: LCSC; Category: Inductors; Supplier Part Number 1: C330867; Tolerance: ±5%; Rated Current: 250mA; DC Resistance: 600mΩ; RoHS: Yes; ComponentLink1Description: Datasheet; ComponentLink1URL: https://wmsc.lcsc.com/wmsc/upload/file/pdf/v2/lcsc/2304140030_Sunltech-Tech-SCW1005C36NJST_C330867.pdf; ComponentLink2Description: JLCPCB Part URL; ComponentLink2URL: https://jlcpcb.com/partdetail/C330867; ComponentLink3Description: LCSC Part URL; ComponentLink3URL: https://lcsc.com/product-detail/Inductors-SMD_Sunltech-Tech-Sunltech-Tech-SCW1005C36NJST_C330867.html
footprint IND-0402 (0402 (1005M) Inductor)
pins: 1, 2

## SCW1005C38NJST
designator L?  Inductance: 38nH
Inductor, 38nH, ±5%, 600mΩ, 250mA, SMD 0402; Manufacturer: Sunltech Tech; Manufacturer Part Number: SCW1005C38NJST; Package Size: 0402; JLCPCB Basic Part: No; JLCPCB Part Number: C330868; Supplier 1: LCSC; Category: Inductors; Supplier Part Number 1: C330868; Tolerance: ±5%; Rated Current: 250mA; DC Resistance: 600mΩ; RoHS: Yes; ComponentLink1Description: Datasheet; ComponentLink1URL: https://wmsc.lcsc.com/wmsc/upload/file/pdf/v2/lcsc/2304140030_Sunltech-Tech-SCW1005C38NJST_C330868.pdf; ComponentLink2Description: JLCPCB Part URL; ComponentLink2URL: https://jlcpcb.com/partdetail/C330868; ComponentLink3Description: LCSC Part URL; ComponentLink3URL: https://lcsc.com/product-detail/Inductors-SMD_Sunltech-Tech-Sunltech-Tech-SCW1005C38NJST_C330868.html
footprint IND-0402 (0402 (1005M) Inductor)
pins: 1, 2

## SCW1005C39NJST
designator L?  Inductance: 39nH
Inductor, 39nH, ±5%, 600mΩ, 250mA, SMD 0402; Manufacturer: Sunltech Tech; Manufacturer Part Number: SCW1005C39NJST; Package Size: 0402; JLCPCB Basic Part: No; JLCPCB Part Number: C330869; Supplier 1: LCSC; Category: Inductors; Supplier Part Number 1: C330869; Tolerance: ±5%; Rated Current: 250mA; DC Resistance: 600mΩ; RoHS: Yes; ComponentLink1Description: Datasheet; ComponentLink1URL: https://wmsc.lcsc.com/wmsc/upload/file/pdf/v2/lcsc/2304140030_Sunltech-Tech-SCW1005C39NJST_C330869.pdf; ComponentLink2Description: JLCPCB Part URL; ComponentLink2URL: https://jlcpcb.com/partdetail/C330869; ComponentLink3Description: LCSC Part URL; ComponentLink3URL: https://lcsc.com/product-detail/Inductors-SMD_Sunltech-Tech-Sunltech-Tech-SCW1005C39NJST_C330869.html
footprint IND-0402 (0402 (1005M) Inductor)
pins: 1, 2

## SCW1005C43NJST
designator L?  Inductance: 43nH
Inductor, 43nH, ±5%, 680mΩ, 240mA, SMD 0402; Manufacturer: Sunltech Tech; Manufacturer Part Number: SCW1005C43NJST; Package Size: 0402; JLCPCB Basic Part: No; JLCPCB Part Number: C330870; Supplier 1: LCSC; Category: Inductors; Supplier Part Number 1: C330870; Tolerance: ±5%; Rated Current: 240mA; DC Resistance: 680mΩ; RoHS: Yes; ComponentLink1Description: Datasheet; ComponentLink1URL: https://wmsc.lcsc.com/wmsc/upload/file/pdf/v2/lcsc/2304140030_Sunltech-Tech-SCW1005C43NJST_C330870.pdf; ComponentLink2Description: JLCPCB Part URL; ComponentLink2URL: https://jlcpcb.com/partdetail/C330870; ComponentLink3Description: LCSC Part URL; ComponentLink3URL: https://lcsc.com/product-detail/Inductors-SMD_Sunltech-Tech-Sunltech-Tech-SCW1005C43NJST_C330870.html
footprint IND-0402 (0402 (1005M) Inductor)
pins: 1, 2

## SCW1005C75NJST
designator L?  Inductance: 75nH
Inductor, 75nH, ±5%, 1.75Ω, 140mA, SMD 0402; Manufacturer: Sunltech Tech; Manufacturer Part Number: SCW1005C75NJST; Package Size: 0402; JLCPCB Basic Part: No; JLCPCB Part Number: C330876; Supplier 1: LCSC; Category: Inductors; Supplier Part Number 1: C330876; Tolerance: ±5%; Rated Current: 140mA; DC Resistance: 1.75Ω; RoHS: Yes; ComponentLink1Description: Datasheet; ComponentLink1URL: https://wmsc.lcsc.com/wmsc/upload/file/pdf/v2/lcsc/2304140030_Sunltech-Tech-SCW1005C75NJST_C330876.pdf; ComponentLink2Description: JLCPCB Part URL; ComponentLink2URL: https://jlcpcb.com/partdetail/C330876; ComponentLink3Description: LCSC Part URL; ComponentLink3URL: https://lcsc.com/product-detail/Inductors-SMD_Sunltech-Tech-Sunltech-Tech-SCW1005C75NJST_C330876.html
footprint IND-0402 (0402 (1005M) Inductor)
pins: 1, 2

## SCW1005C91NJST
designator L?  Inductance: 91nH
Inductor, 91nH, ±5%, 1.95Ω, 140mA, SMD 0402; Manufacturer: Sunltech Tech; Manufacturer Part Number: SCW1005C91NJST; Package Size: 0402; JLCPCB Basic Part: No; JLCPCB Part Number: C330878; Supplier 1: LCSC; Category: Inductors; Supplier Part Number 1: C330878; Tolerance: ±5%; Rated Current: 140mA; DC Resistance: 1.95Ω; RoHS: Yes; ComponentLink1Description: Datasheet; ComponentLink1URL: https://wmsc.lcsc.com/wmsc/upload/file/pdf/v2/lcsc/2304140030_Sunltech-Tech-SCW1005C91NJST_C330878.pdf; ComponentLink2Description: JLCPCB Part URL; ComponentLink2URL: https://jlcpcb.com/partdetail/C330878; ComponentLink3Description: LCSC Part URL; ComponentLink3URL: https://lcsc.com/product-detail/Inductors-SMD_Sunltech-Tech-Sunltech-Tech-SCW1005C91NJST_C330878.html
footprint IND-0402 (0402 (1005M) Inductor)
pins: 1, 2

## SDCL1005C0N3BTDFM01
designator L?  Inductance: 0.3nH
Inductor, 0.3nH, SMD 0402; Manufacturer: Sunlord; Manufacturer Part Number: SDCL1005C0N3BTDFM01; Package Size: 0402; JLCPCB Basic Part: No; JLCPCB Part Number: C370187; Supplier 1: LCSC; Category: Inductors; Supplier Part Number 1: C370187; RoHS: Yes; ComponentLink1Description: Datasheet; ComponentLink1URL: https://wmsc.lcsc.com/wmsc/upload/file/pdf/v2/lcsc/2207131030_Sunlord-SDCL1005C0N3BTDFM01_C370187.pdf; ComponentLink2Description: JLCPCB Part URL; ComponentLink2URL: https://jlcpcb.com/partdetail/C370187; ComponentLink3Description: LCSC Part URL; ComponentLink3URL: https://lcsc.com/product-detail/Inductors-SMD_Sunlord-Sunlord-SDCL1005C0N3BTDFM01_C370187.html
footprint IND-0402 (0402 (1005M) Inductor)
pins: 1, 2

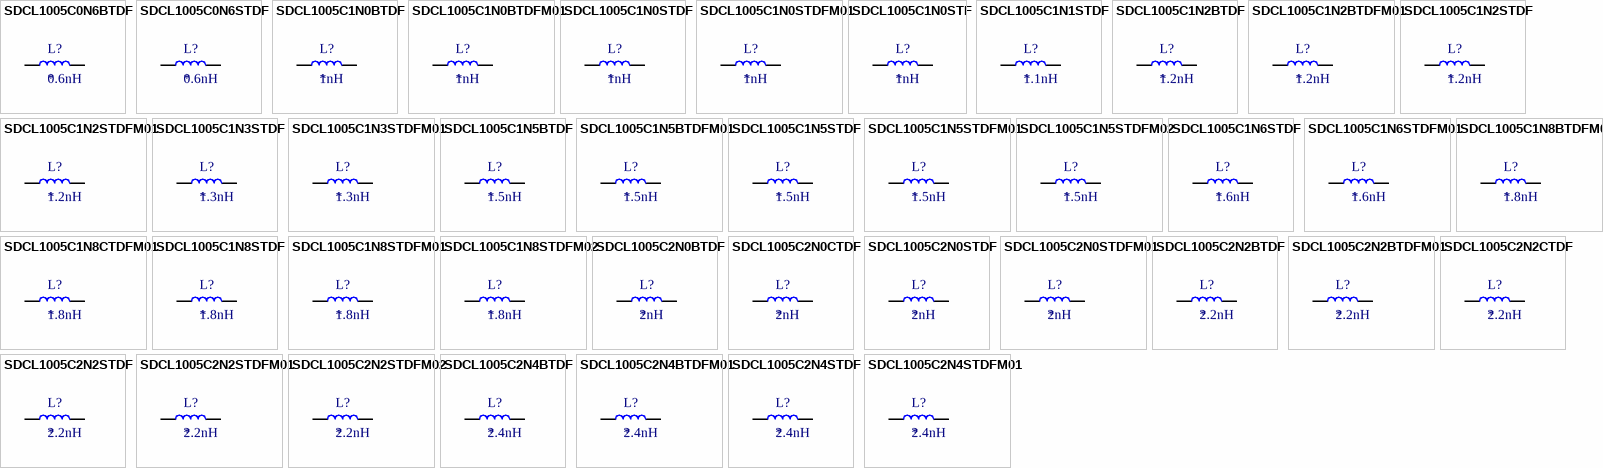
[diagram p26: symbols SDCL1005C0N6BTDF to SDCL1005C2N4STDFM01]

## SDCL1005C0N6BTDF
designator L?  Inductance: 0.6nH
Inductor, 0.6nH, 100mΩ, 800mA, SMD 0402; Manufacturer: Sunlord; Manufacturer Part Number: SDCL1005C0N6BTDF; Package Size: 0402; JLCPCB Basic Part: No; JLCPCB Part Number: C279865; Supplier 1: LCSC; Category: Inductors; Supplier Part Number 1: C279865; Rated Current: 800mA; DC Resistance: 100mΩ; RoHS: Yes; ComponentLink1Description: Datasheet; ComponentLink1URL: https://wmsc.lcsc.com/wmsc/upload/file/pdf/v2/lcsc/2310271701_Sunlord-SDCL1005C0N6BTDF_C279865.pdf; ComponentLink2Description: JLCPCB Part URL; ComponentLink2URL: https://jlcpcb.com/partdetail/C279865; ComponentLink3Description: LCSC Part URL; ComponentLink3URL: https://lcsc.com/product-detail/Inductors-SMD_Sunlord-Sunlord-SDCL1005C0N6BTDF_C279865.html
footprint IND-0402 (0402 (1005M) Inductor)
pins: 1, 2

## SDCL1005C0N6STDF
designator L?  Inductance: 0.6nH
Inductor, 0.6nH, 100mΩ, 800mA, SMD 0402; Manufacturer: Sunlord; Manufacturer Part Number: SDCL1005C0N6STDF; Package Size: 0402; JLCPCB Basic Part: No; JLCPCB Part Number: C316416; Supplier 1: LCSC; Category: Inductors; Supplier Part Number 1: C316416; Rated Current: 800mA; DC Resistance: 100mΩ; RoHS: Yes; ComponentLink1Description: Datasheet; ComponentLink1URL: https://wmsc.lcsc.com/wmsc/upload/file/pdf/v2/lcsc/2310301641_Sunlord-SDCL1005C0N6STDF_C316416.pdf; ComponentLink2Description: JLCPCB Part URL; ComponentLink2URL: https://jlcpcb.com/partdetail/C316416; ComponentLink3Description: LCSC Part URL; ComponentLink3URL: https://lcsc.com/product-detail/Inductors-SMD_Sunlord-Sunlord-SDCL1005C0N6STDF_C316416.html
footprint IND-0402 (0402 (1005M) Inductor)
pins: 1, 2

## SDCL1005C1N0BTDF
designator L?  Inductance: 1nH
Inductor, 1nH, 100mΩ, 400mA, SMD 0402; Manufacturer: Sunlord; Manufacturer Part Number: SDCL1005C1N0BTDF; Self-Resonant Frequency: 10GHz; Q Factor: 8@100MHz; Package Size: 0402; JLCPCB Basic Part: No; JLCPCB Part Number: C781678; Supplier 1: LCSC; Category: Inductors; Supplier Part Number 1: C781678; Rated Current: 400mA; DC Resistance: 100mΩ; RoHS: Yes; ComponentLink1Description: Datasheet; ComponentLink1URL: https://wmsc.lcsc.com/wmsc/upload/file/pdf/v2/lcsc/2310301641_Sunlord-SDCL1005C1N0BTDF_C781678.pdf; ComponentLink2Description: JLCPCB Part URL; ComponentLink2URL: https://jlcpcb.com/partdetail/C781678; ComponentLink3Description: LCSC Part URL; ComponentLink3URL: https://lcsc.com/product-detail/Inductors-SMD_Sunlord-Sunlord-SDCL1005C1N0BTDF_C781678.html
footprint IND-0402 (0402 (1005M) Inductor)
pins: 1, 2

## SDCL1005C1N0BTDFM01
designator L?  Inductance: 1nH
Inductor, 1nH, SMD 0402; Manufacturer: Sunlord; Manufacturer Part Number: SDCL1005C1N0BTDFM01; Package Size: 0402; JLCPCB Basic Part: No; JLCPCB Part Number: C370191; Supplier 1: LCSC; Category: Inductors; Supplier Part Number 1: C370191; RoHS: Yes; ComponentLink1Description: Datasheet; ComponentLink1URL: https://wmsc.lcsc.com/wmsc/upload/file/pdf/v2/lcsc/2110081430_Sunlord-SDCL1005C1N0BTDFM01_C370191.pdf; ComponentLink2Description: JLCPCB Part URL; ComponentLink2URL: https://jlcpcb.com/partdetail/C370191; ComponentLink3Description: LCSC Part URL; ComponentLink3URL: https://lcsc.com/product-detail/Inductors-SMD_Sunlord-Sunlord-SDCL1005C1N0BTDFM01_C370191.html
footprint IND-0402 (0402 (1005M) Inductor)
pins: 1, 2

## SDCL1005C1N0STDF
designator L?  Inductance: 1nH
Inductor, 1nH, 100mΩ, 400mA, SMD 0402; Manufacturer: Sunlord; Manufacturer Part Number: SDCL1005C1N0STDF; Self-Resonant Frequency: 100MHz; Q Factor: 8@100MHz; Package Size: 0402; JLCPCB Basic Part: No; JLCPCB Part Number: C57117; Supplier 1: LCSC; Category: Inductors; Supplier Part Number 1: C57117; Rated Current: 400mA; DC Resistance: 100mΩ; RoHS: Yes; ComponentLink1Description: Datasheet; ComponentLink1URL: https://wmsc.lcsc.com/wmsc/upload/file/pdf/v2/lcsc/2310301641_Sunlord-SDCL1005C1N0STDF_C57117.pdf; ComponentLink2Description: JLCPCB Part URL; ComponentLink2URL: https://jlcpcb.com/partdetail/C57117; ComponentLink3Description: LCSC Part URL; ComponentLink3URL: https://lcsc.com/product-detail/Inductors-SMD_Sunlord-Sunlord-SDCL1005C1N0STDF_C57117.html
footprint IND-0402 (0402 (1005M) Inductor)
pins: 1, 2

## SDCL1005C1N0STDFM01
designator L?  Inductance: 1nH
Inductor, 1nH, 100mΩ, 400mA, SMD 0402; Manufacturer: Sunlord; Manufacturer Part Number: SDCL1005C1N0STDFM01; Package Size: 0402; JLCPCB Basic Part: No; JLCPCB Part Number: C74299; Supplier 1: LCSC; Category: Inductors; Supplier Part Number 1: C74299; Rated Current: 400mA; DC Resistance: 100mΩ; RoHS: Yes; ComponentLink1Description: Datasheet; ComponentLink1URL: https://wmsc.lcsc.com/wmsc/upload/file/pdf/v2/lcsc/2110081230_Sunlord-SDCL1005C1N0STDFM01_C74299.pdf; ComponentLink2Description: JLCPCB Part URL; ComponentLink2URL: https://jlcpcb.com/partdetail/C74299; ComponentLink3Description: LCSC Part URL; ComponentLink3URL: https://lcsc.com/product-detail/Inductors-SMD_Sunlord-Sunlord-SDCL1005C1N0STDFM01_C74299.html
footprint IND-0402 (0402 (1005M) Inductor)
pins: 1, 2

## SDCL1005C1N0STF
designator L?  Inductance: 1nH
Inductor, 1nH, 100mΩ, 400mA, SMD 0402; Manufacturer: Sunlord; Manufacturer Part Number: SDCL1005C1N0STF; Package Size: 0402; JLCPCB Basic Part: No; JLCPCB Part Number: C57306; Supplier 1: LCSC; Category: Inductors; Supplier Part Number 1: C57306; Rated Current: 400mA; DC Resistance: 100mΩ; RoHS: Yes; ComponentLink1Description: Datasheet; ComponentLink1URL: https://wmsc.lcsc.com/wmsc/upload/file/pdf/v2/lcsc/2110081230_Sunlord-SDCL1005C1N0STF_C57306.pdf; ComponentLink2Description: JLCPCB Part URL; ComponentLink2URL: https://jlcpcb.com/partdetail/C57306; ComponentLink3Description: LCSC Part URL; ComponentLink3URL: https://lcsc.com/product-detail/Inductors-SMD_Sunlord-Sunlord-SDCL1005C1N0STF_C57306.html
footprint IND-0402 (0402 (1005M) Inductor)
pins: 1, 2

## SDCL1005C1N1STDF
designator L?  Inductance: 1.1nH
Inductor, 1.1nH, 100mΩ, 400mA, SMD 0402; Manufacturer: Sunlord; Manufacturer Part Number: SDCL1005C1N1STDF; Self-Resonant Frequency: 100MHz; Q Factor: 8@100MHz; Package Size: 0402; JLCPCB Basic Part: No; JLCPCB Part Number: C279556; Supplier 1: LCSC; Category: Inductors; Supplier Part Number 1: C279556; Rated Current: 400mA; DC Resistance: 100mΩ; RoHS: Yes; ComponentLink1Description: Datasheet; ComponentLink1URL: https://wmsc.lcsc.com/wmsc/upload/file/pdf/v2/lcsc/2310301641_Sunlord-SDCL1005C1N1STDF_C279556.pdf; ComponentLink2Description: JLCPCB Part URL; ComponentLink2URL: https://jlcpcb.com/partdetail/C279556; ComponentLink3Description: LCSC Part URL; ComponentLink3URL: https://lcsc.com/product-detail/Inductors-SMD_Sunlord-Sunlord-SDCL1005C1N1STDF_C279556.html
footprint IND-0402 (0402 (1005M) Inductor)
pins: 1, 2

## SDCL1005C1N2BTDF
designator L?  Inductance: 1.2nH
Inductor, 1.2nH, 100mΩ, 400mA, SMD 0402; Manufacturer: Sunlord; Manufacturer Part Number: SDCL1005C1N2BTDF; Package Size: 0402; JLCPCB Basic Part: No; JLCPCB Part Number: C370192; Supplier 1: LCSC; Category: Inductors; Supplier Part Number 1: C370192; Rated Current: 400mA; DC Resistance: 100mΩ; RoHS: Yes; ComponentLink1Description: Datasheet; ComponentLink1URL: https://wmsc.lcsc.com/wmsc/upload/file/pdf/v2/lcsc/2310301641_Sunlord-SDCL1005C1N2BTDF_C370192.pdf; ComponentLink2Description: JLCPCB Part URL; ComponentLink2URL: https://jlcpcb.com/partdetail/C370192; ComponentLink3Description: LCSC Part URL; ComponentLink3URL: https://lcsc.com/product-detail/Inductors-SMD_Sunlord-Sunlord-SDCL1005C1N2BTDF_C370192.html
footprint IND-0402 (0402 (1005M) Inductor)
pins: 1, 2

## SDCL1005C1N2BTDFM01
designator L?  Inductance: 1.2nH
Inductor, 1.2nH, SMD 0402; Manufacturer: Sunlord; Manufacturer Part Number: SDCL1005C1N2BTDFM01; Package Size: 0402; JLCPCB Basic Part: No; JLCPCB Part Number: C370193; Supplier 1: LCSC; Category: Inductors; Supplier Part Number 1: C370193; RoHS: Yes; ComponentLink1Description: Datasheet; ComponentLink1URL: https://wmsc.lcsc.com/wmsc/upload/file/pdf/v2/lcsc/2110081430_Sunlord-SDCL1005C1N2BTDFM01_C370193.pdf; ComponentLink2Description: JLCPCB Part URL; ComponentLink2URL: https://jlcpcb.com/partdetail/C370193; ComponentLink3Description: LCSC Part URL; ComponentLink3URL: https://lcsc.com/product-detail/Inductors-SMD_Sunlord-Sunlord-SDCL1005C1N2BTDFM01_C370193.html
footprint IND-0402 (0402 (1005M) Inductor)
pins: 1, 2

## SDCL1005C1N2STDF
designator L?  Inductance: 1.2nH
Inductor, 1.2nH, 100mΩ, 400mA, SMD 0402; Manufacturer: Sunlord; Manufacturer Part Number: SDCL1005C1N2STDF; Self-Resonant Frequency: 100MHz; Q Factor: 8@100MHz; Package Size: 0402; JLCPCB Basic Part: No; JLCPCB Part Number: C14475; Supplier 1: LCSC; Category: Inductors; Supplier Part Number 1: C14475; Rated Current: 400mA; DC Resistance: 100mΩ; RoHS: Yes; ComponentLink1Description: Datasheet; ComponentLink1URL: https://wmsc.lcsc.com/wmsc/upload/file/pdf/v2/lcsc/2310301641_Sunlord-SDCL1005C1N2STDF_C14475.pdf; ComponentLink2Description: JLCPCB Part URL; ComponentLink2URL: https://jlcpcb.com/partdetail/C14475; ComponentLink3Description: LCSC Part URL; ComponentLink3URL: https://lcsc.com/product-detail/Inductors-SMD_Sunlord-Sunlord-SDCL1005C1N2STDF_C14475.html
footprint IND-0402 (0402 (1005M) Inductor)
pins: 1, 2
